# Altium footprint library HW_Dron_V2.PcbLib: 55 footprints (part 4 of 4)
Each footprint in its own frame and in the unit in brackets; x right, y up, seen from the top. Pads: shape width x height; smd on the part's side, far side on the other; paste and mask are expansions set on the pad; w line width, h text height; cw(c..) or ccw(c..) is an arc to the next point about the centre after c.
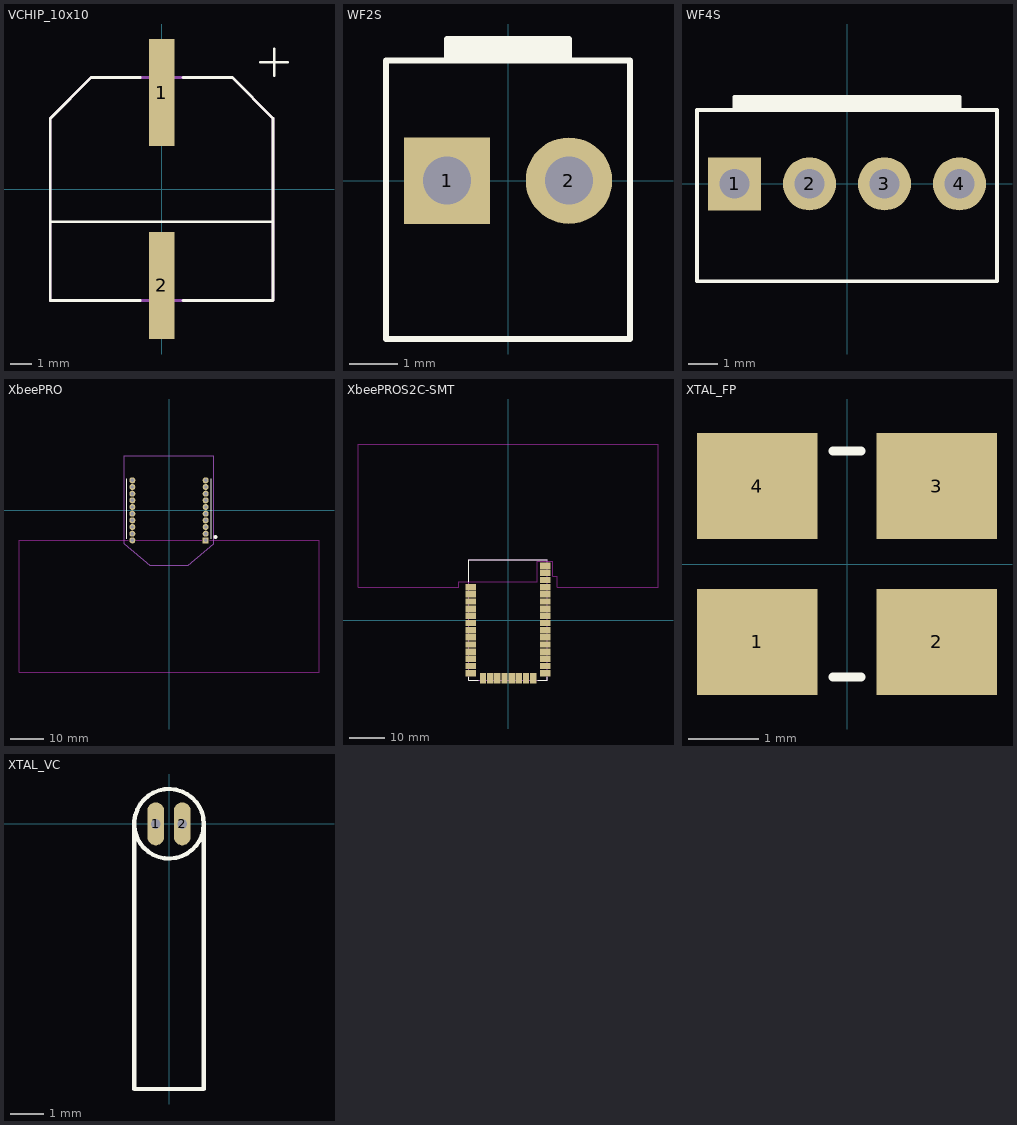
[diagram p3: the footprints below, top view; thin cyan lines are the x and y axes]

## VCHIP_10x10 [mm] "Electrolitico SMD 10x10"
height 10.5
pads (2):
  rect 1.2x5 smd: 1(0,4.5) 2(0,-4.5)
Top Overlay:
  lines w0.127: -5.2,-1.524 5.2,-1.524 ; -1,-5.2 -5.2,-5.2 -5.2,3.3 -3.3,5.2 -1,5.2 ; 1,-5.2 5.2,-5.2 5.2,3.3 3.3,5.2 1,5.2 ; 4.615,5.915 5.885,5.915 ; 5.25,5.28 5.25,6.55
Mechanical 13:
  lines w0.127: -5.2,3.3 -3.3,5.2 ; -5.2,3.3 -5.2,-5.2 5.2,-5.2 5.2,3.3 3.3,5.2 -3.3,5.2
3D body: height 10.5, standoff 0, extent -5.25,-5.899 5.25,5.901

## WF2S [mm]
pads (2):
  rect 1.8x1.8 hole 1: 1(-1.27,0)
  round 1.8 hole 1: 2(1.27,0)
Top Overlay:
  region: -1.27,2.95 1.27,2.95 1.27,2.52 -1.27,2.52
  lines w0.127: -1.27,2.52 -1.27,2.95 1.27,2.95 1.27,2.52 ; -2.54,-3.3 -2.54,2.5 2.54,2.5 2.54,-3.3 -2.54,-3.3
3D body: height 11.73, standoff -2.55, extent -2.6,-3.2 2.6,2.7

## WF4S [mm]
pads (4):
  rect 1.8x1.8 hole 1: 1(-3.81,0)
  round 1.8 hole 1: 2(-1.27,0) 3(1.27,0) 4(3.81,0)
Top Overlay:
  region: -3.81,2.95 3.81,2.95 3.81,2.52 -3.81,2.52
  lines w0.127: -3.81,2.52 -3.81,2.95 3.81,2.95 3.81,2.52 ; -5.08,-3.3 -5.08,2.5 5.08,2.5 5.08,-3.3 -5.08,-3.3
3D body: height 11.73, standoff -2.55, extent -5.08,-3.175 5.08,2.725

## XbeePRO [mm]
height 3
pads (20):
  rect 1.8x1.8 hole 1: 1(11,-9)
  round 1.8 hole 1: 2(11,-7) 3(11,-5) 4(11,-3) 5(11,-1) 6(11,1) 7(11,3) 8(11,5) 9(11,7) 10(11,9) 11(-11,9) 12(-11,7) 13(-11,5) 14(-11,3) 15(-11,1) 16(-11,-1) 17(-11,-3) 18(-11,-5) 19(-11,-7) 20(-11,-9)
Top Overlay:
  circle w0.635: c13.921,-7.984 r0.284
  lines w0.127: -12.7,-8.5 -12.7,9.5 ; 12.7,-8.5 12.7,9.5
Keep-Out Layer:
  lines w0.127: -12.25,-9 -45,-9 -45,-48.6 45,-48.6 45,-9 12.25,-9 ; -9.75,-9 9.75,-9
Mechanical 13:
  lines w0.127: -13.38,-10 -5.79,-16.53 5.79,-16.53 13.38,-10 13.38,16.41 -13.38,16.41 -13.38,-10
3D body: height 6.96, standoff -2.92, extent -12.114,-30.971 12.27,16.4

## XbeePROS2C-SMT [mil]
height 120
pads (37):
  rect 120x70 smd: 1(-410,363) 2(-410,284) 3(-410,205) 4(-410,126) 5(-410,47) 6(-410,-32) 7(-410,-111) 8(-410,-190) 9(-410,-269) 10(-410,-348) 11(-410,-427) 12(-410,-506) 13(-410,-585) 22(410,-585) 23(410,-506) 24(410,-427) 25(410,-348) 26(410,-269) 27(410,-190) 28(410,-111) 29(410,-32) 30(410,47) 31(410,126) 32(410,205) 33(410,284) 34(410,363) 35(410,442) 36(410,521) 37(410,600)
  rect 70x120 smd: 14(-275,-640) 15(-196,-640) 16(-117,-640) 17(-38,-640) 18(41,-640) 19(120,-640) 20(199,-640) 21(278,-640)
Top Overlay:
  lines w5: -435,-631.85 -435,-665 -330,-665 ; -435,425.16 -435,665 435,665 ; 330,-665 435,-665 435,-631.85
Keep-Out Layer:
  lines w5: -1653.54,363 -1653.54,1937.8 1653.54,1937.8 1653.54,363 541.34,363 541.34,482.28 492.13,482.28 492.13,649.61 324.8,649.61 324.8,423.23 -295.28,423.23 -541.34,423.23 -541.34,363 -1653.54,363
Mechanical 13:
  lines w5: -435,-665 435,-665 435,665 -435,665 -435,-665
3D body: height 120.5, standoff 0, extent -432.93,-665 433.07,665

## XTAL_FP [mm]
height 0.018
pads (4):
  rect 1.7x1.5 smd: 1(-1.27,-1.1) 2(1.27,-1.1) 3(1.27,1.1) 4(-1.27,1.1)
Top Overlay:
  lines w0.127: -0.2,-1.6 0.2,-1.6 ; -0.2,1.6 0.2,1.6
  text "." at -2.794,-1.905 h0.76
3D body: height 1.73, standoff 0.41, extent -2.473,-1.6 2.527,1.6

## XTAL_VC [mm]
pads (2):
  oval 0.5x1.3 hole 0.3: 1(-0.4,0) 2(0.4,0)
Top Overlay:
  circle w0.127: c0,0 r1.05
  lines w0.127: -1.05,0 -1.05,-8 1.05,-8 1.05,0
3D body: height 1.95, standoff -2, extent -1.143,-8.112 1.157,0.238